# Altium footprint library Разъемы.PcbLib: 291 footprints (part 3 of 19)
Each footprint in its own frame and in the unit in brackets; x right, y up, seen from the top. Pads: shape width x height; smd on the part's side, far side on the other; paste and mask are expansions set on the pad; w line width, h text height; cw(c..) or ccw(c..) is an arc to the next point about the centre after c.
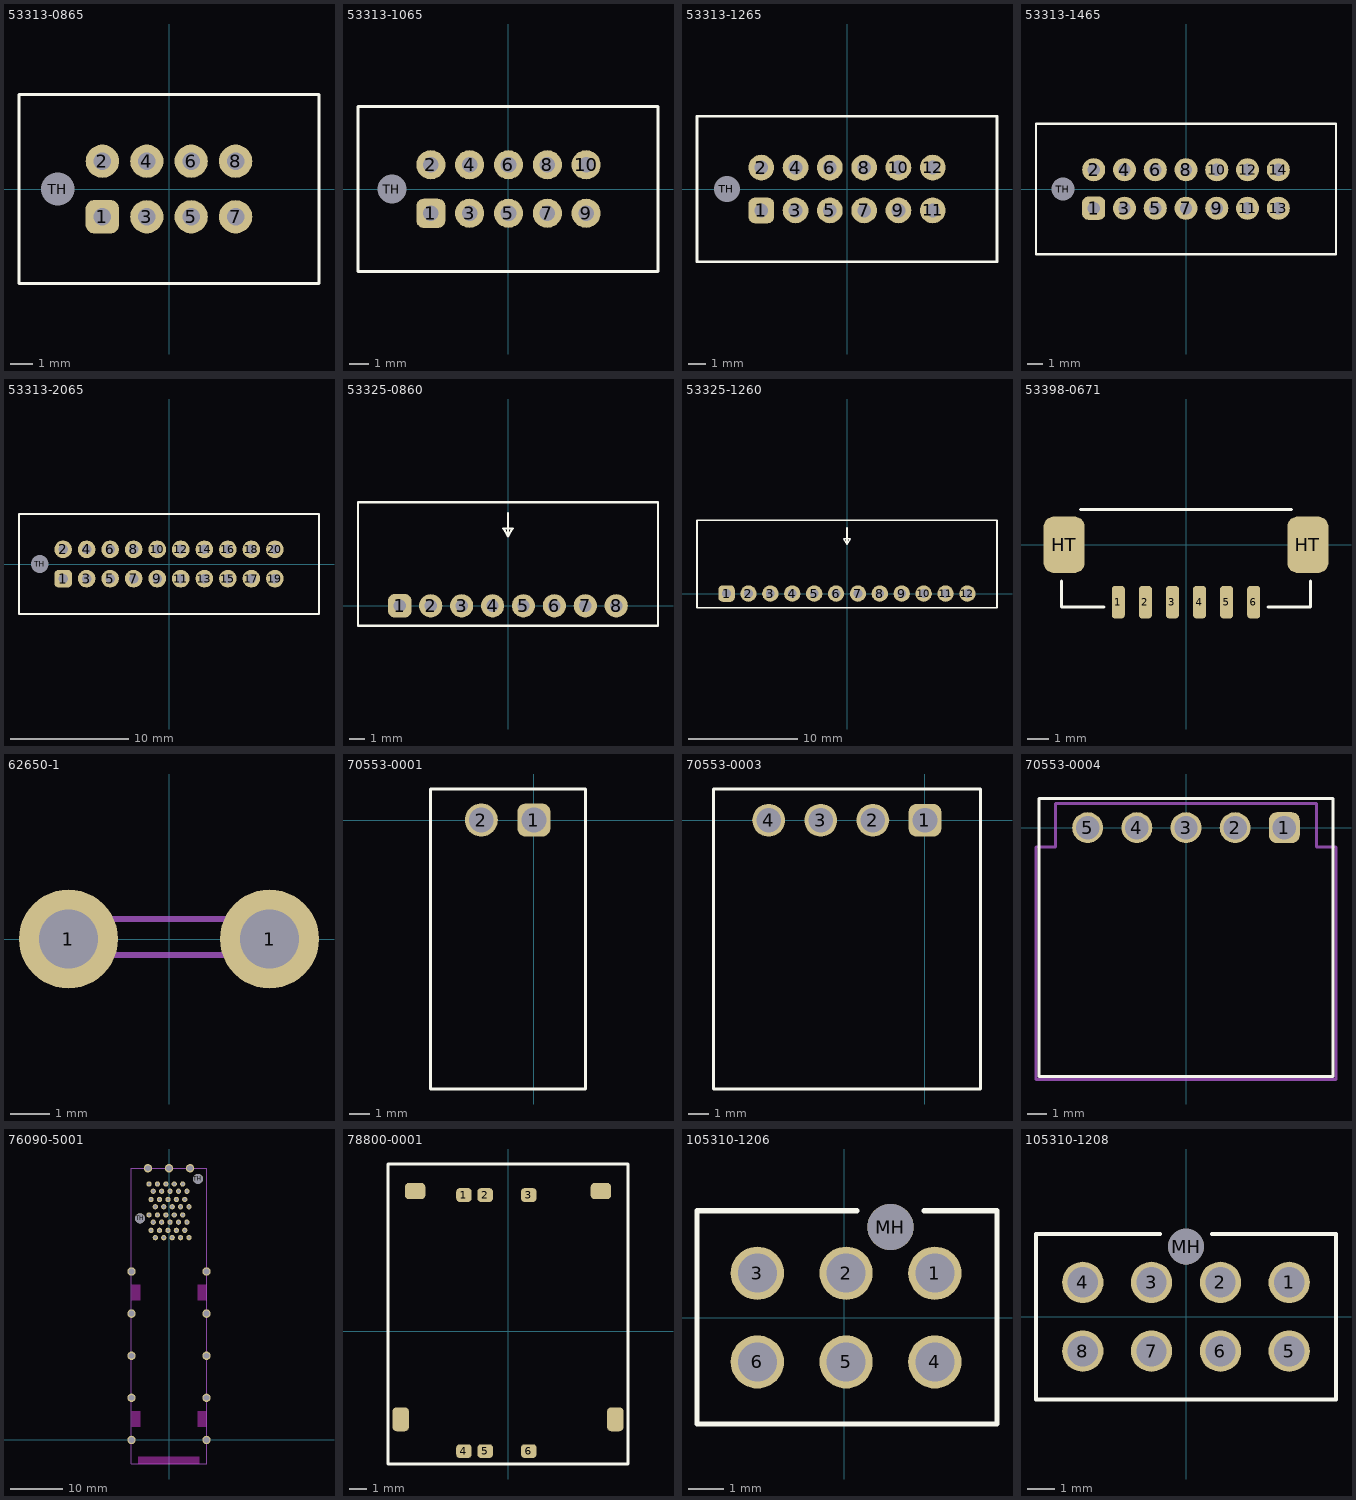
[diagram p2: the footprints below, top view; thin cyan lines are the x and y axes]

## 53313-0865 [mm]
height 7
pads (9):
  rrect50% 1.5x1.5 hole 0.8: 1(-3,-1.25)
  round 1.5 hole 0.8: 2(-3,1.25) 3(-1,-1.25) 4(-1,1.25) 5(1,-1.25) 6(1,1.25) 7(3,-1.25) 8(3,1.25)
  round 1 hole 1.5: TH(-5,0)
Top Overlay:
  lines w0.15: -6.75,-4.25 -6.75,4.25 6.75,4.25 6.75,-4.25 -6.75,-4.25
  text "." at -3.5,-4.75 h0.1
3D body "533130865.stp": height 6.75, standoff -3.25, extent -6.7,-4.25 6.7,4.25

## 53313-1065 [mm]
height 7
pads (11):
  rrect50% 1.5x1.5 hole 0.8: 1(-4,-1.25)
  round 1.5 hole 0.8: 2(-4,1.25) 3(-2,-1.25) 4(-2,1.25) 5(0,-1.25) 6(0,1.25) 7(2,-1.25) 8(2,1.25) 9(4,-1.25) 10(4,1.25)
  round 1 hole 1.5: TH(-6,0)
Top Overlay:
  lines w0.15: -7.75,-4.25 7.7,-4.25 7.7,4.25 -7.75,4.25 -7.75,-4.25
  text "." at -4.25,-5 h0.1
3D body "533131065.stp": height 6.75, standoff -3.25, extent -7.7,-4.25 7.7,4.25

## 53313-1265 [mm]
pads (13):
  rrect50% 1.5x1.5 hole 0.8: 1(-5,-1.25)
  round 1.5 hole 0.8: 2(-5,1.25) 3(-3,-1.25) 4(-3,1.25) 5(-1,-1.25) 6(-1,1.25) 7(1,-1.25) 8(1,1.25) 9(3,-1.25) 10(3,1.25) 11(5,-1.25) 12(5,1.25)
  round 1 hole 1.5: TH(-7,0)
Top Overlay:
  lines w0.15: -8.75,-4.25 8.75,-4.25 8.75,4.25 -8.75,4.25 -8.75,-4.25
  text "." at -5,-4.75 h0.1
3D body "533131265.stp": height 6.75, standoff -3.25, extent -8.7,-4.25 8.7,4.25

## 53313-1465 [mm]
height 7
pads (15):
  rrect50% 1.5x1.5 hole 0.8: 1(-6,-1.25)
  round 1.5 hole 0.8: 2(-6,1.25) 3(-4,-1.25) 4(-4,1.25) 5(-2,-1.25) 6(-2,1.25) 7(0,-1.25) 8(0,1.25) 9(2,-1.25) 10(2,1.25) 11(4,-1.25) 12(4,1.25) 13(6,-1.25) 14(6,1.25)
  round 1 hole 1.5: TH(-8,0)
Top Overlay:
  lines w0.15: -9.75,-4.25 -9.75,4.25 9.75,4.25 9.75,-4.25 -9.75,-4.25
  text "." at -6,-4.75 h0.1
3D body "533131465.stp": height 6.75, standoff -3.25, extent -9.7,-4.25 9.7,4.25

## 53313-2065 [mm]
height 7
pads (21):
  rrect50% 1.5x1.5 hole 0.8: 1(-9,-1.25)
  round 1.5 hole 0.8: 2(-9,1.25) 3(-7,-1.25) 4(-7,1.25) 5(-5,-1.25) 6(-5,1.25) 7(-3,-1.25) 8(-3,1.25) 9(-1,-1.25) 10(-1,1.25) 11(1,-1.25) 12(1,1.25) 13(3,-1.25) 14(3,1.25) 15(5,-1.25) 16(5,1.25) 17(7,-1.25) 18(7,1.25) 19(9,-1.25) 20(9,1.25)
  round 1 hole 1.5: TH(-11,0)
Top Overlay:
  lines w0.15: -12.75,-4.25 12.75,-4.25 12.75,4.25 -12.75,4.25 -12.75,-4.25
  text "." at -9,-5 h0.1
3D body "533132065.stp": height 6.75, standoff -3.25, extent -12.65,-4.25 12.75,4.25

## 53325-0860 [mm]
height 5
pads (8):
  rrect50% 1.5x1.5 hole 0.8: 1(-7,0)
  round 1.5 hole 0.8: 2(-5,0) 3(-3,0) 4(-1,0) 5(1,0) 6(3,0) 7(5,0) 8(7,0)
Top Overlay:
  lines w0.15: 0,6 0,4.5 ; 0,4.5 0.3,5 -0.3,5 0,4.5 ; -9.7,-1.3 9.7,-1.3 9.7,6.7 -9.7,6.7 -9.7,-1.3
  text "." at -7,-2 h0.1
3D body "533250860.stp": height 4.95, standoff -3.4, extent -9.65,-1.3 9.65,6.65

## 53325-1260 [mm]
height 5
pads (12):
  rrect50% 1.5x1.5 hole 0.8: 1(-11,0)
  round 1.5 hole 0.8: 2(-9,0) 3(-7,0) 4(-5,0) 5(-3,0) 6(-1,0) 7(1,0) 8(3,0) 9(5,0) 10(7,0) 11(9,0) 12(11,0)
Top Overlay:
  lines w0.15: 0,6 0,4.5 ; 0,4.5 -0.3,5 0.3,5 0,4.5 ; -13.7,-1.3 -13.7,6.7 13.7,6.7 13.7,-1.3 -13.7,-1.3
  text "." at -11,-1.75 h0.1
3D body "533251260.stp": height 4.95, standoff -3.4, extent -13.65,-1.35 13.65,6.6

## 53398-0671 [mm] "Molex, LLC 0533980671, CONN HEADER 6POS 1.25MM VERT SMD"
height 4.8
pads (8):
  rrect50% 0.6x1.5 smd: 1(-3.125,-2.65) 2(-1.875,-2.65) 3(-0.625,-2.65) 4(0.625,-2.65) 5(1.875,-2.65) 6(3.125,-2.65)
  rrect50% 1.9x2.6 smd: HT(-5.625,0) HT(5.625,0)
Top Overlay:
  lines w0.15: -5.75,-2.875 -5.75,-1.677 -5.75,-2.875 ; -5.75,-2.875 -3.802,-2.875 -5.75,-2.875 ; 5.75,-2.875 5.75,-1.677 5.75,-2.875 ; 5.75,-2.875 3.802,-2.875 5.75,-2.875 ; -4.858,1.625 0,1.625 4.858,1.625 -4.858,1.625
  text "." at -4,-3.75 h0.1
3D body "533980671.stp": height 4.7, standoff 0, extent -6.325,-2.75 6.325,1.45

## 62650-1 [mm]
height 10
pads (2):
  round 2.5 hole 1.5: 1(-2.54,0) 1(2.54,0)
Mechanical 29:
  lines w0.15: -3.5,-0.4 3.5,-0.4 3.5,0.5 -3.5,0.5 -3.5,-0.4
3D body "62650-1.STEP": height 9.19, standoff -3.18, extent -3.555,-0.42 3.555,0.42

## 70553-0001 [mm] "Molex, 2.54mm Pitch SLпїЅ Header, Low Profile, Single Row, Right Angle, 3.05mm Pocket, Shrouded, 2 Circuits, 0.38пїЅm Gold (Au) Selective Plating, Tin (Sn) PC Tail Plating"
pads (2):
  rrect50% 1.6x1.6 hole 1.2: 1(0,0)
  round 1.6 hole 1.2: 2(-2.54,0)
Top Overlay:
  lines w0.15: -5,-13 2.5,-13 2.5,1.5 -5,1.5 -5,-13
  text "." at 0.75,2 h0.1
3D body "705530001.stp": height 6.98, standoff -3.3, extent -4.953,-12.89 2.413,0.699

## 70553-0003 [mm] "Molex 2.54mm Pitch SLпїЅ Header, Low Profile, Single Row, Right Angle, 3.05mm Pocket, Shrouded, 4 Circuits, 0.38пїЅm Gold (Au) Selective Plating, Tin (Sn) PC Tail Plating"
pads (4):
  rrect50% 1.6x1.6 hole 1.2: 1(0,0)
  round 1.6 hole 1.2: 2(-2.54,0) 3(-5.08,0) 4(-7.62,0)
Top Overlay:
  lines w0.15: -10.3,-13.1 2.7,-13.1 2.7,1.524 -10.3,1.524 -10.3,-13.1
  text "." at 0.25,2 h0.1
3D body "705530003.stp": height 6.98, standoff -3.3, extent -10.16,-12.89 2.54,0.699

## 70553-0004 [mm] "Molex, 2.54mm Pitch SLпїЅ Header, Low Profile, Single Row, Right Angle, 3.05mm Pocket, Shrouded, 5 Circuits, 0.38пїЅm Gold (Au) Selective Plating, Tin (Sn) PC Tail Plating"
pads (5):
  rrect50% 1.6x1.6 hole 1.2: 1(5.08,0)
  round 1.6 hole 1.2: 2(2.54,0) 3(0,0) 4(-2.54,0) 5(-5.08,0)
Top Overlay:
  lines w0.15: -7.6,-12.86 7.6,-12.86 7.6,1.5 -7.6,1.5 -7.6,-12.86
  text "." at 5.25,2 h0.1
Top Courtyard:
  lines w0.15: -7.75,-13 -7.75,-1 -6.75,-1 -6.75,1.25 6.75,1.25 6.75,-1 7.75,-1 7.75,-13 -0.17,-13 -7.75,-13
3D body "705530004.stp": height 6.98, standoff -3.3, extent -7.62,-12.89 7.62,0.699

## 76090-5001 [mm] "Small Form-factor Pluggable Plus (SFP+) Stacked 2-by-1 Multi-Port Connector with 4 Lightpipe Ports, Elastomeric Gasket, 40 Circuits, Tin (Sn) Tails"
height 26
pads (55):
  round 1 hole 0.6: L1(3.4,41.37) L2(2.6,42.75) L3(1.8,41.37) L4(1,42.75) L5(0.2,41.37) L6(-0.6,42.75) L7(-1.4,41.37) L8(-2.2,42.75) L9(-3,41.37) L10(-3.8,42.75) L11(-3.4,39.82) L12(-2.6,38.43) L13(-1.8,39.82) L14(-1,38.43) L15(-0.2,39.82) L16(0.6,38.43) L17(1.4,39.82) L18(2.2,38.43) L19(3,39.82) L20(3.8,38.43) T1(-3.4,45.69) T2(-2.6,44.3) T3(-1.8,45.69) T4(-1,44.3) T5(-0.2,45.69) T6(0.6,44.3) T7(1.4,45.69) T8(2.2,44.3) T9(3,45.69) T10(3.8,44.3) T11(3.4,47.24) T12(2.6,48.62) T13(1.8,47.24) T14(1,48.62) T15(0.2,47.24) T16(-0.6,48.62) T17(-1.4,47.24) T18(-2.2,48.62) T19(-3,47.24) T20(-3.8,48.62)
  round 1.6 hole 1.1: TH(-7.125,0) TH(-7.125,8) TH(-7.125,16) TH(-7.125,24) TH(-7.125,32) TH(-4,51.625) TH(0,51.625) TH(4,51.625) TH(7.125,0) TH(7.125,8) TH(7.125,16) TH(7.125,24) TH(7.125,32)
  round 1.9 hole 1.9: TH(-5.5,42.1) TH(5.5,49.6)
Keep-Out Layer:
  rectangle: -5.855,-4.572 5.829,-3.175
  rectangle: -7.125,2.5 -5.375,5.5
  rectangle: -7.125,26.5 -5.375,29.5
  region: 7.125,29.5 5.375,29.5 5.375,26.5 7.125,26.5
  region: 7.125,5.5 5.375,5.5 5.375,2.5 7.125,2.5
Mechanical 29:
  lines w0.15: -7.125,-4.5 7.125,-4.5 7.125,51.625 -7.125,51.625 -7.125,-4.5
3D body "760905001.stp": height 28.15, standoff -3.32, extent -9.75,-11.5 9.75,51.75

## 78800-0001 [mm] "Molex, 1.50mm Height Hinged-style micro-SIM Card Socket without Detect Switch, Surface Mount, 6 Circuits, Low-Halogen, Lead-Free"
height 1.5
pads (10):
  rrect50% 0.9x0.8 smd: 1(-2.57,7.94) 2(-1.33,7.94) 3(1.21,7.94) 4(-2.57,-7) 5(-1.33,-7) 6(1.21,-7)
  rrect50% 0.95x1.4 smd: ""(-6.26,-5.14) ""(6.26,-5.14)
  rrect50% 1.2x0.95 smd: ""(-5.42,8.17) ""(5.42,8.17)
Top Overlay:
  lines w0.15: -7,-7.75 7,-7.75 7,9.75 -7,9.75 -7,-7.75
3D body "788000001.stp": height 1.48, standoff -0.02, extent -6.92,-7.3 6.93,9.66

## 105310-1206 [mm]
pads (7):
  round 1.5 hole 1.1: 1(2.55,1.25) 2(0.05,1.25) 3(-2.45,1.25) 4(2.55,-1.25) 5(0.05,-1.25) 6(-2.45,-1.25)
  round 1.3 hole 1.3 unplated: MH(1.3,2.55)
Top Overlay:
  lines w0.15: 0.35,3.01 -4.15,3.01 -4.15,-3 4.3,-3 4.3,3.01 2.25,3.01
  text "." at 3,3.5 h0.1
3D body "1053101206.stp": height 10.68, standoff -3.03, extent -4.17,-2.99 4.27,5.85

## 105310-1208 [mm]
pads (9):
  round 1.5 hole 1.1: 1(3.75,1.25) 2(1.25,1.25) 3(-1.25,1.25) 4(-3.75,1.25) 5(3.75,-1.25) 6(1.25,-1.25) 7(-1.25,-1.25) 8(-3.75,-1.25)
  round 1.3 hole 1.3 unplated: MH(0,2.55)
Top Overlay:
  lines w0.15: -0.95,3.01 -5.45,3.01 -5.45,-3 5.45,-3 5.45,3.01 0.95,3.01
  text "." at 4.5,3.5 h0.1
3D body "1053101208.stp": height 10.68, standoff -3.03, extent -5.47,-2.99 5.47,5.85